# Altium footprint library LimeMicroAltiumLib.PcbLib: 760 footprints (part 38 of 50)
Each footprint in its own frame and in the unit in brackets; x right, y up, seen from the top. Pads: shape width x height; smd on the part's side, far side on the other; paste and mask are expansions set on the pad; w line width, h text height; cw(c..) or ccw(c..) is an arc to the next point about the centre after c.
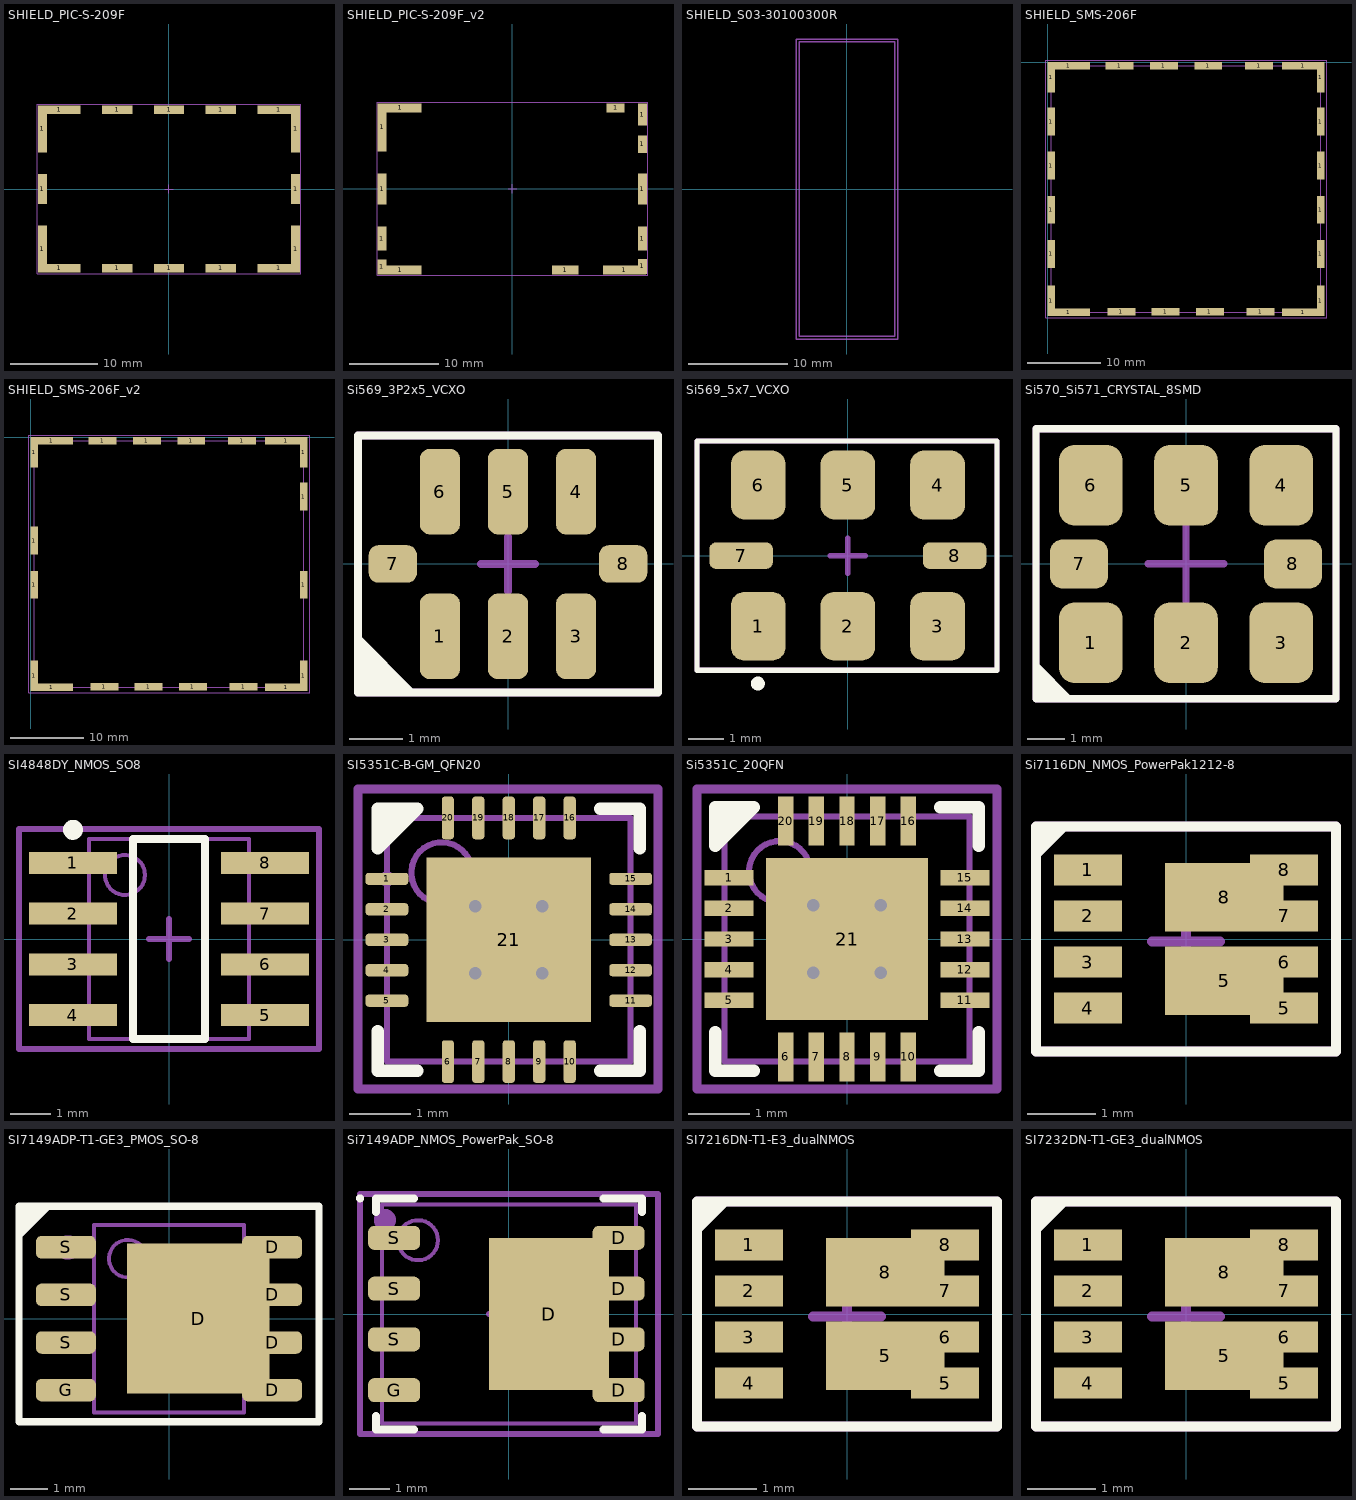
[diagram p37: the footprints below, top view; thin cyan lines are the x and y axes]

## SHIELD_PIC-S-209F [mm]
pads (16):
  rect 1x5.4 smd mask+0.05: 1(-14.55,-6.925) 1(-14.55,6.925) 1(14.55,-6.925) 1(14.55,6.925)
  rect 1x3.5 smd mask+0.05: 1(-14.55,0) 1(14.55,0)
  rect 4.85x1 smd mask+0.05: 1(-12.625,-9.125) 1(-12.625,9.125) 1(12.625,-9.125) 1(12.625,9.125)
  rect 3.5x1 smd mask+0.05: 1(-5.975,-9.125) 1(-5.975,9.125) 1(0,-9.125) 1(0,9.125) 1(5.975,-9.125) 1(5.975,9.125)
Mechanical 15:
  lines w0.1: -0.5,0 0,0 ; 0,-0.5 0,0 ; 0,0.5 0,0 ; 0.5,0 0,0 ; -15.15,-9.725 15.15,-9.725 15.15,9.725 -15.15,9.725 -15.15,-9.725
  text ".Designator" at 0,0 h0.55
  text "RFI shield frame" at -3.7,-9.2 h0.55

## SHIELD_PIC-S-209F_v2 [mm]
pads (14):
  rect 1x1.7 smd mask+0.05: 1(-14.675,-8.8) 1(14.625,-8.725)
  rect 1x2.7 smd mask+0.05: 1(-14.675,-5.6) 1(14.625,-5.6)
  rect 1x3.5 smd mask+0.05: 1(-14.675,-0.025) 1(14.625,-0.025)
  rect 1x5.4 smd mask+0.05: 1(-14.675,6.9)
  rect 4.85x1 smd mask+0.05: 1(-12.65,-9.15) 1(-12.65,9.1) 1(12.6,-9.15)
  rect 3x1 smd mask+0.05: 1(5.95,-9.15)
  rect 2x1 smd mask+0.05: 1(11.6,9.1)
  rect 1x2 smd mask+0.05: 1(14.625,5)
  rect 1x2.5 smd mask+0.05: 1(14.625,8.35)
Mechanical 15:
  lines w0.1: -0.5,0 0,0 ; 0,-0.5 0,0 ; 0,0.5 0,0 ; 0.5,0 0,0 ; -15.225,-9.725 -15.225,9.725 15.225,9.725 15.225,-9.725 -15.225,-9.725
  text "RFI shield frame" at -3.775,-9.2 h0.55
  text ".Designator" at 0,0 h0.55

## SHIELD_S03-30100300R [mm] "RF Shield CAN 0.394\" (10.00mm) X 1.181\" (30.00mm) Non-Vented Surface Mount"
Mechanical 13:
  lines w0.1: -5.075,-15.025 -5.075,15.075 5.075,15.075 5.075,-15.025 -5.075,-15.025
Mechanical 15:
  lines w0.15: -5.1,-15.025 -5.1,15.075 5.1,15.075 5.1,-15.025 -5.1,-15.025 ; -4.8,-14.725 -4.8,14.775 4.8,14.775 4.8,-14.725 -4.8,-14.725
  text ".Designator" at 0.075,-0.375 h0.55
  text "RF shield" at -2.5,-13.625 h0.55
3D body "s03-30100300.stp": height 3.4, standoff 0.25, extent -5.075,-15.075 5.075,15.075

## SHIELD_SMS-206F [mm] "RF Shield  Frame+Cover 1.348\" (34.24mm) X 1.472\" (37.39mm) Vented Surface Mount"
pads (24):
  rect 1x4.14 smd mask+0.05: 1(0.5,-32.402) 1(0.5,-2.075) 1(37.143,-32.402) 1(37.143,-2.075)
  rect 1x3.785 smd mask+0.05: 1(0.5,-26.055) 1(0.5,-20.06) 1(0.5,-14.065) 1(0.5,-8.07) 1(37.143,-26.055) 1(37.143,-20.06) 1(37.143,-14.065) 1(37.143,-8.07)
  rect 5.715x1 smd mask+0.05: 1(2.9,-33.977) 1(2.9,-0.5) 1(34.743,-33.977) 1(34.743,-0.5)
  rect 3.81x1 smd mask+0.05: 1(9.8,-0.5) 1(10.025,-33.925) 1(28.75,-0.5) 1(28.975,-33.925)
  rect 3.785x1 smd mask+0.05: 1(15.825,-0.5) 1(16.05,-33.925) 1(21.85,-0.5) 1(22.075,-33.925)
Mechanical 13:
  lines w0.1: 0.5,-33.977 37.143,-33.977 37.143,-0.5 0.5,-0.5 0.5,-33.977
Mechanical 15:
  lines w0.15: -0.25,-34.75 37.925,-34.75 37.925,0.275 -0.25,0.275 -0.25,-34.75
  text "RF shield" at 31.15,-33.05 h0.55
  text ".Designator" at 18.375,-17.15 h0.55

## SHIELD_SMS-206F_v2 [mm] "RF Shield  Frame+Cover 1.348\" (34.24mm) X 1.472\" (37.39mm) Vented Surface Mount"
pads (20):
  rect 1x4.14 smd mask+0.05: 1(0.5,-32.402) 1(0.5,-2.075) 1(37.143,-32.402) 1(37.143,-2.075)
  rect 1x3.785 smd mask+0.05: 1(0.5,-20.06) 1(0.5,-14.065) 1(37.143,-20.06) 1(37.143,-8.07)
  rect 5.715x1 smd mask+0.05: 1(2.9,-33.977) 1(2.9,-0.5) 1(34.743,-33.977) 1(34.743,-0.5)
  rect 3.81x1 smd mask+0.05: 1(9.8,-0.5) 1(10.025,-33.925) 1(28.75,-0.5) 1(28.975,-33.925)
  rect 3.785x1 smd mask+0.05: 1(15.825,-0.5) 1(16.05,-33.925) 1(21.85,-0.5) 1(22.075,-33.925)
Mechanical 13:
  lines w0.1: 0.5,-33.977 0.5,-0.5 37.143,-0.5 37.143,-33.977 0.5,-33.977
Mechanical 15:
  lines w0.15: -0.25,-34.75 -0.25,0.275 37.925,0.275 37.925,-34.75 -0.25,-34.75
  text ".Designator" at 18.375,-17.15 h0.55
  text "RF shield" at 31.15,-33.05 h0.55

## Si569_3P2x5_VCXO [mm]
pads (8):
  rrect50% 0.75x1.6 smd mask+0.05: 1(-1.27,-1.35) 2(0,-1.35) 3(1.27,-1.35) 4(1.27,1.35) 5(0,1.35) 6(-1.27,1.35)
  rrect50% 0.9x0.7 smd mask+0.05: 7(-2.15,0) 8(2.15,0)
Top Overlay:
  region: -1.7,-2.4 -2.8,-1.3 -2.8,-2.4
  lines w0.15: -2.8,-2.4 -2.8,2.4 2.8,2.4 2.8,-2.4 -2.8,-2.4
Mechanical 15:
  lines w0.15: -0.5,0 0.5,0 ; 0,-0.5 0,0.5 ; -2.8,-2.4 2.8,-2.4 2.8,2.4 -2.8,2.4 -2.8,-2.4
  text ".Designator" at 0,0 h0.55
  text "1" at -1.25,-1.75 h0.55
  text "2" at -0.2,-1.7 h0.55
  text "3" at 1.1,-1.7 h0.55
  text "4" at 1.1,1.1 h0.55
  text "5" at -0.2,1.1 h0.55
  text "6" at -1.5,1.1 h0.55
  text "7" at -2.3,-0.3 h0.55
  text "8" at 2,-0.3 h0.55
3D body: height 1.13, standoff 0, extent -2.5,-1.6 2.5,1.6

## Si569_5x7_VCXO [mm]
pads (8):
  rrect50% 1.55x1.95 smd mask+0.05: 1(-2.54,-2) 2(0,-2) 3(2.54,-2) 4(2.54,2) 5(0,2) 6(-2.54,2)
  rrect50% 1.8x0.75 smd mask+0.05: 7(-3.025,0) 8(3.025,0)
Top Overlay:
  circle w0.2: c-2.55,-3.625 r0.1
  lines w0.15: -4.275,-3.25 -4.275,3.25 4.225,3.25 4.225,-3.25 -4.275,-3.25
Mechanical 15:
  lines w0.15: -0.5,0 0.5,0 ; 0,-0.5 0,0.5 ; -4.275,-3.25 4.225,-3.25 4.225,3.25 -4.275,3.25 -4.275,-3.25
  text ".Designator" at 0,0 h0.55
  text "1" at -2.6,-2.2 h0.55
  text "2" at -0.2,-2.2 h0.55
  text "3" at 2.3,-2.2 h0.55
  text "4" at 2.3,1.8 h0.55
  text "5" at -0.2,1.8 h0.55
  text "6" at -2.6,1.8 h0.55
  text "7" at -3.2,-0.3 h0.55
  text "8" at 2.9,-0.3 h0.55
3D body: height 1.13, standoff 0, extent -3.5,-2.5 3.5,2.5

## Si570_Si571_CRYSTAL_8SMD [mm]
pads (8):
  rrect50% 1.7x2.15 smd mask+0.05: 1(-2.54,-2.1) 2(0,-2.1) 3(2.54,-2.1) 4(2.54,2.1) 5(0,2.1) 6(-2.54,2.1)
  rrect50% 1.545x1.3 smd mask+0.05: 7(-2.852,0) 8(2.852,0)
Top Overlay:
  region: -4,-3.6 -3,-3.6 -4,-2.6
  lines w0.2: -4,-3.6 -4,3.6 4,3.6 4,-3.6 -4,-3.6
Mechanical 15:
  circle w0.2: c-2.4,-2.1 r0.141
  lines w0.2: -1,0 0,0 ; 0,-1 0,0 ; 0,1 0,0 ; 1,0 0,0 ; -4,-3.6 4,-3.6 4,3.6 -4,3.6 -4,-3.6
  text ".Designator" at 0,0 h0.55
3D body: height 1.65, standoff 0, extent 5,-5 5,-5
3D body: height 1.65, standoff 0, extent -3.5,-2.5 3.5,2.5
3D body: height 1.66, standoff 0, extent -3.199,-2.2 -2.801,-1.8

## SI4848DY_NMOS_SO8 [mm] "SOIC, 8-Leads, Body 4,90x3,90mm, Pitch 1,27mm, IPC Medium Density"
height 1.7
pads (8):
  rect 2.2x0.55 smd: 1(-2.4,1.905) 2(-2.4,0.635) 3(-2.4,-0.635) 4(-2.4,-1.905) 5(2.4,-1.905) 6(2.4,-0.635) 7(2.4,0.635) 8(2.4,1.905)
Top Overlay:
  circle w0.25: c-2.4,2.73 r0.125
  lines w0.2: -0.9,-2.5 0.9,-2.5 0.9,2.5 -0.9,2.5 -0.9,-2.5
Mechanical 13:
  circle w0.1: c-1.1,1.6 r0.5
  lines w0.1: -2,-2.5 2,-2.5 2,2.5 -2,2.5 -2,-2.5
Mechanical 15:
  lines w0.15: -0.5,0 0.5,0 ; 0,-0.5 0,0.5 ; -3.75,-2.75 3.75,-2.75 3.75,2.75 -3.75,2.75 -3.75,-2.75
  text ".Designator" at 0,0 h0.55
3D body "CircuitWorks-SO-8.step": height 1.45, standoff 0, extent -2.889,-2.45 2.889,2.452

## SI5351C-B-GM_QFN20 [mm] "QFN, 20-Leads, Body 4,00x4,00mm, Pitch 0,50mm, Thermal Pad 2,70x2,70mm, IPC Medium Density"
height 0.85
pads (21):
  rrect50% 0.7x0.2 smd mask+0.05: 1(-2,1) 2(-2,0.5) 3(-2,0) 4(-2,-0.5) 5(-2,-1) 11(2,-1) 12(2,-0.5) 13(2,0) 14(2,0.5) 15(2,1)
  rrect50% 0.2x0.7 smd mask+0.05: 6(-1,-2) 7(-0.5,-2) 8(0,-2) 9(0.5,-2) 10(1,-2) 16(1,2) 17(0.5,2) 18(0,2) 19(-0.5,2) 20(-1,2)
  rect 2.7x2.7 smd mask+0.05: 21(0,0)
via 0.55,-0.55 diameter 0.5 hole 0.2
via -0.55,-0.55 diameter 0.5 hole 0.2
via 0.55,0.55 diameter 0.5 hole 0.2
via -0.55,0.55 diameter 0.5 hole 0.2
Top Overlay:
  region: -2.15,1.4 -1.4,2.15 -2.15,2.15
  lines w0.2: -2.15,-1.5 -2.15,-2.15 -1.5,-2.15 ; 1.5,-2.15 2.15,-2.15 2.15,-1.5 ; 1.5,2.15 2.15,2.15 2.15,1.5 ; -2.15,1.5 -2.15,2.15 -1.5,2.15 -2.15,1.5
Mechanical 13:
  circle w0.1: c-1.1,1.1 r0.5
  lines w0.1: -2,-2 2,-2 2,2 -2,2 -2,-2
Mechanical 15:
  circle w0.15: c-2,1 r0.05
  lines w0.15: -0.5,0 0.5,0 ; 0,-0.5 0,0.5 ; -2.475,-2.45 2.45,-2.45 2.45,2.475 -2.475,2.475 -2.475,-2.45
  text ".Designator" at 0,0 h0.55
3D body "User Library-QFN4x4_20pins.step": height 0.8, standoff 0, extent -2.02,-2.02 2.02,2.02

## Si5351C_20QFN [mm] "QFN, 20-Leads, Body 4,00x4,00mm, Pitch 0,50mm, Thermal Pad 2,70x2,70mm, IPC Medium Density"
height 0.8
pads (21):
  rect 0.8x0.25 smd mask+0.05: 1(-1.925,1) 2(-1.925,0.5) 3(-1.925,0) 4(-1.925,-0.5) 5(-1.925,-1) 11(1.925,-1) 12(1.925,-0.5) 13(1.925,0) 14(1.925,0.5) 15(1.925,1)
  rect 0.25x0.8 smd mask+0.05: 6(-1,-1.925) 7(-0.5,-1.925) 8(0,-1.925) 9(0.5,-1.925) 10(1,-1.925) 16(1,1.925) 17(0.5,1.925) 18(0,1.925) 19(-0.5,1.925) 20(-1,1.925)
  rect 2.65x2.65 smd mask+0.05: 21(0,0)
via -0.55,0.55 diameter 0.4 hole 0.2
via 0.55,0.55 diameter 0.4 hole 0.2
via -0.55,-0.55 diameter 0.4 hole 0.2
via 0.55,-0.55 diameter 0.4 hole 0.2
Top Overlay:
  region: -2.15,1.425 -1.425,2.15 -2.15,2.15
  lines w0.2: -2.15,-1.525 -2.15,-2.15 -1.525,-2.15 ; 1.525,-2.15 2.15,-2.15 2.15,-1.525 ; 1.525,2.15 2.15,2.15 2.15,1.525 ; -2.15,1.525 -2.15,2.15 -1.525,2.15 -2.15,1.525
Mechanical 13:
  circle w0.1: c-1.1,1.1 r0.5
  lines w0.1: -2,-2 -2,2 2,2 2,-2 -2,-2
Mechanical 15:
  lines w0.15: -0.5,0 0.5,0 ; 0,-0.5 0,0.5 ; -2.45,-2.45 -2.45,2.45 2.45,2.45 2.45,-2.45 -2.45,-2.45
  text ".Designator" at 0,0 h0.55
3D body "User Library-QFN4x4_20pins.step": height 0.8, standoff 0, extent -2.02,-2.02 2.02,2.02

## Si7116DN_NMOS_PowerPak1212-8 [mm]
height 1.7
pads (10):
  rect 1x0.45 smd mask+0.05: 1(-1.438,1.012) 2(-1.438,0.337) 3(-1.438,-0.337) 4(-1.438,-1.012) 5(1.438,-1.012) 6(1.438,-0.337) 7(1.438,0.337) 8(1.438,1.012)
  rect 1.74x1 smd mask+0.05: 5(0.563,-0.612) 8(0.563,0.612)
Top Overlay:
  region: -2.2,1.65 -2.2,1.15 -1.7,1.65
  lines w0.15: -2.2,-1.65 2.2,-1.65 2.2,1.65 -2.2,1.65 -2.2,-1.65
Mechanical 15:
  lines w0.15: -0.5,-0.038 0,-0.038 ; 0,-0.537 0,-0.038 ; 0,0.462 0,-0.038 ; 0.5,-0.038 0,-0.038 ; -2.2,-1.65 -2.2,1.65 2.2,1.65 2.2,-1.65 -2.2,-1.65
  text "1" at -1.525,0.725 h0.55
  text ".Designator" at 0,-0.038 h0.55
  text "4" at -1.9,-1.538 h0.55
3D body "User Library-PowerPAK 1212-8-SiS892DN.step": height 1.04, standoff 0, extent -1.65,-1.65 1.65,1.65

## SI7149ADP-T1-GE3_PMOS_SO-8 [mm] "SOIC, 8-Leads, Body 4.9x3.9mm, Pitch 1.27mm, IPC Medium Density"
height 1.75
pads (9):
  rect 3.8x4 smd mask+0.1: D(0.775,0)
  rrect50% 1.6x0.6 smd: D(2.75,-1.905) D(2.75,-0.635) D(2.75,0.635) D(2.75,1.905) G(-2.75,-1.905) S(-2.75,-0.635) S(-2.75,0.635) S(-2.75,1.905)
Top Overlay:
  region: -3.1,3 -4,2.1 -4,3
  lines w0.2: -4,-2.75 4,-2.75 4,3 -4,3 -4,-2.75
Mechanical 13:
  circle w0.1: c-1.1,1.6 r0.5
  lines w0.1: -2,-2.5 2,-2.5 2,2.5 -2,2.5 -2,-2.5
Mechanical 15:
  circle w0.35: c-2.7,1.9 r0.15
  lines w0.15: -0.5,0 0.5,0 ; 0,-0.5 0,0.5 ; -4,-2.75 4,-2.75 4,3 -4,3 -4,-2.75
  text ".Designator" at 0,0 h0.55

## Si7149ADP_NMOS_PowerPak_SO-8 [mm]
height 1.7
pads (9):
  rect 3x3.8 smd paste-2.025: D(1,0)
  rrect50% 1.3x0.6 smd: D(2.745,-1.905) D(2.745,-0.635) D(2.745,0.635) D(2.745,1.905) G(-2.87,-1.905) S(-2.87,-0.635) S(-2.87,0.635) S(-2.87,1.905)
Top Overlay:
  circle w0.1: c-3.725,2.895 r0.05
  lines w0.2: -3.325,-2.555 -3.325,-2.895 -2.37,-2.895 ; -3.325,2.555 -3.325,2.895 -2.37,2.895 ; 2.37,-2.895 3.325,-2.895 3.325,-2.555 ; 2.37,2.895 3.325,2.895 3.325,2.555
Mechanical 13:
  circle w0.1: c-2.275,1.845 r0.5
  lines w0.1: -3.175,-2.745 -3.175,2.745 3.175,2.745 3.175,-2.745 -3.175,-2.745
Mechanical 15:
  circle w0.35: c-3.1,2.35 r0.1
  lines w0.15: -0.5,0 0.5,0 ; 0,-0.5 0,0.5 ; -3.73,-3 -3.73,3 3.73,3 3.73,-3 -3.73,-3
  text "8" at 1.65,1.6 h0.55
  text "7" at 1.675,0.3 h0.55
  text "6" at 1.625,-0.95 h0.55
  text "5" at 1.625,-2.2 h0.55
  text "4" at -2.15,-2.2 h0.55
  text "3" at -2.125,-0.9 h0.55
  text "2" at -2.1,0.4 h0.55
  text "1" at -1.975,1.675 h0.55
  text ".Designator" at 0,0 h0.55
3D body "User Library-PowerPAK SO-8 (S).step": height 1.04, standoff 0, extent -3.075,-2.575 3.075,2.575

## SI7216DN-T1-E3_dualNMOS [mm]
pads (10):
  rect 1x0.45 smd mask+0.05: 1(-1.438,1.012) 2(-1.438,0.337) 3(-1.438,-0.337) 4(-1.438,-1.012) 5(1.438,-1.012) 6(1.438,-0.337) 7(1.438,0.337) 8(1.438,1.012)
  rect 1.74x1 smd mask+0.05: 5(0.563,-0.612) 8(0.563,0.612)
Top Overlay:
  region: -2.2,1.65 -2.2,1.15 -1.7,1.65
  lines w0.15: -2.2,-1.65 -2.2,1.65 2.2,1.65 2.2,-1.65 -2.2,-1.65
Mechanical 15:
  lines w0.15: -0.5,-0.038 0,-0.038 ; 0,-0.537 0,-0.038 ; 0,0.462 0,-0.038 ; 0.5,-0.038 0,-0.038 ; -2.2,-1.65 2.2,-1.65 2.2,1.65 -2.2,1.65 -2.2,-1.65
  text "4" at -1.9,-1.538 h0.55
  text "1" at -1.7,0.462 h0.55
  text ".Designator" at 0,-0.038 h0.55
3D body "User Library-SI7913DN-T1-GE3.step": height 1.12, standoff 0, extent -1.655,-1.65 1.655,1.65

## SI7232DN-T1-GE3_dualNMOS [mm]
pads (10):
  rect 1x0.45 smd mask+0.05: 1(-1.438,1.012) 2(-1.438,0.337) 3(-1.438,-0.337) 4(-1.438,-1.012) 5(1.438,-1.012) 6(1.438,-0.337) 7(1.438,0.337) 8(1.438,1.012)
  rect 1.74x1 smd mask+0.05: 5(0.563,-0.612) 8(0.563,0.612)
Top Overlay:
  region: -2.2,1.65 -2.2,1.15 -1.7,1.65
  lines w0.15: -2.2,-1.65 -2.2,1.65 2.2,1.65 2.2,-1.65 -2.2,-1.65
Mechanical 15:
  lines w0.15: -0.5,-0.038 0,-0.038 ; 0,-0.537 0,-0.038 ; 0,0.462 0,-0.038 ; 0.5,-0.038 0,-0.038 ; -2.2,-1.65 2.2,-1.65 2.2,1.65 -2.2,1.65 -2.2,-1.65
  text "4" at -1.9,-1.538 h0.55
  text "1" at -1.7,0.462 h0.55
  text ".Designator" at 0,-0.038 h0.55
3D body "User Library-SI7913DN-T1-GE3.step": height 1.12, standoff 0, extent -1.655,-1.65 1.655,1.65